# Altium footprint library Connectors THD.PcbLib: 631 footprints (part 3 of 46)
Each footprint in its own frame and in the unit in brackets; x right, y up, seen from the top. Pads: shape width x height; smd on the part's side, far side on the other; paste and mask are expansions set on the pad; w line width, h text height; cw(c..) or ccw(c..) is an arc to the next point about the centre after c.
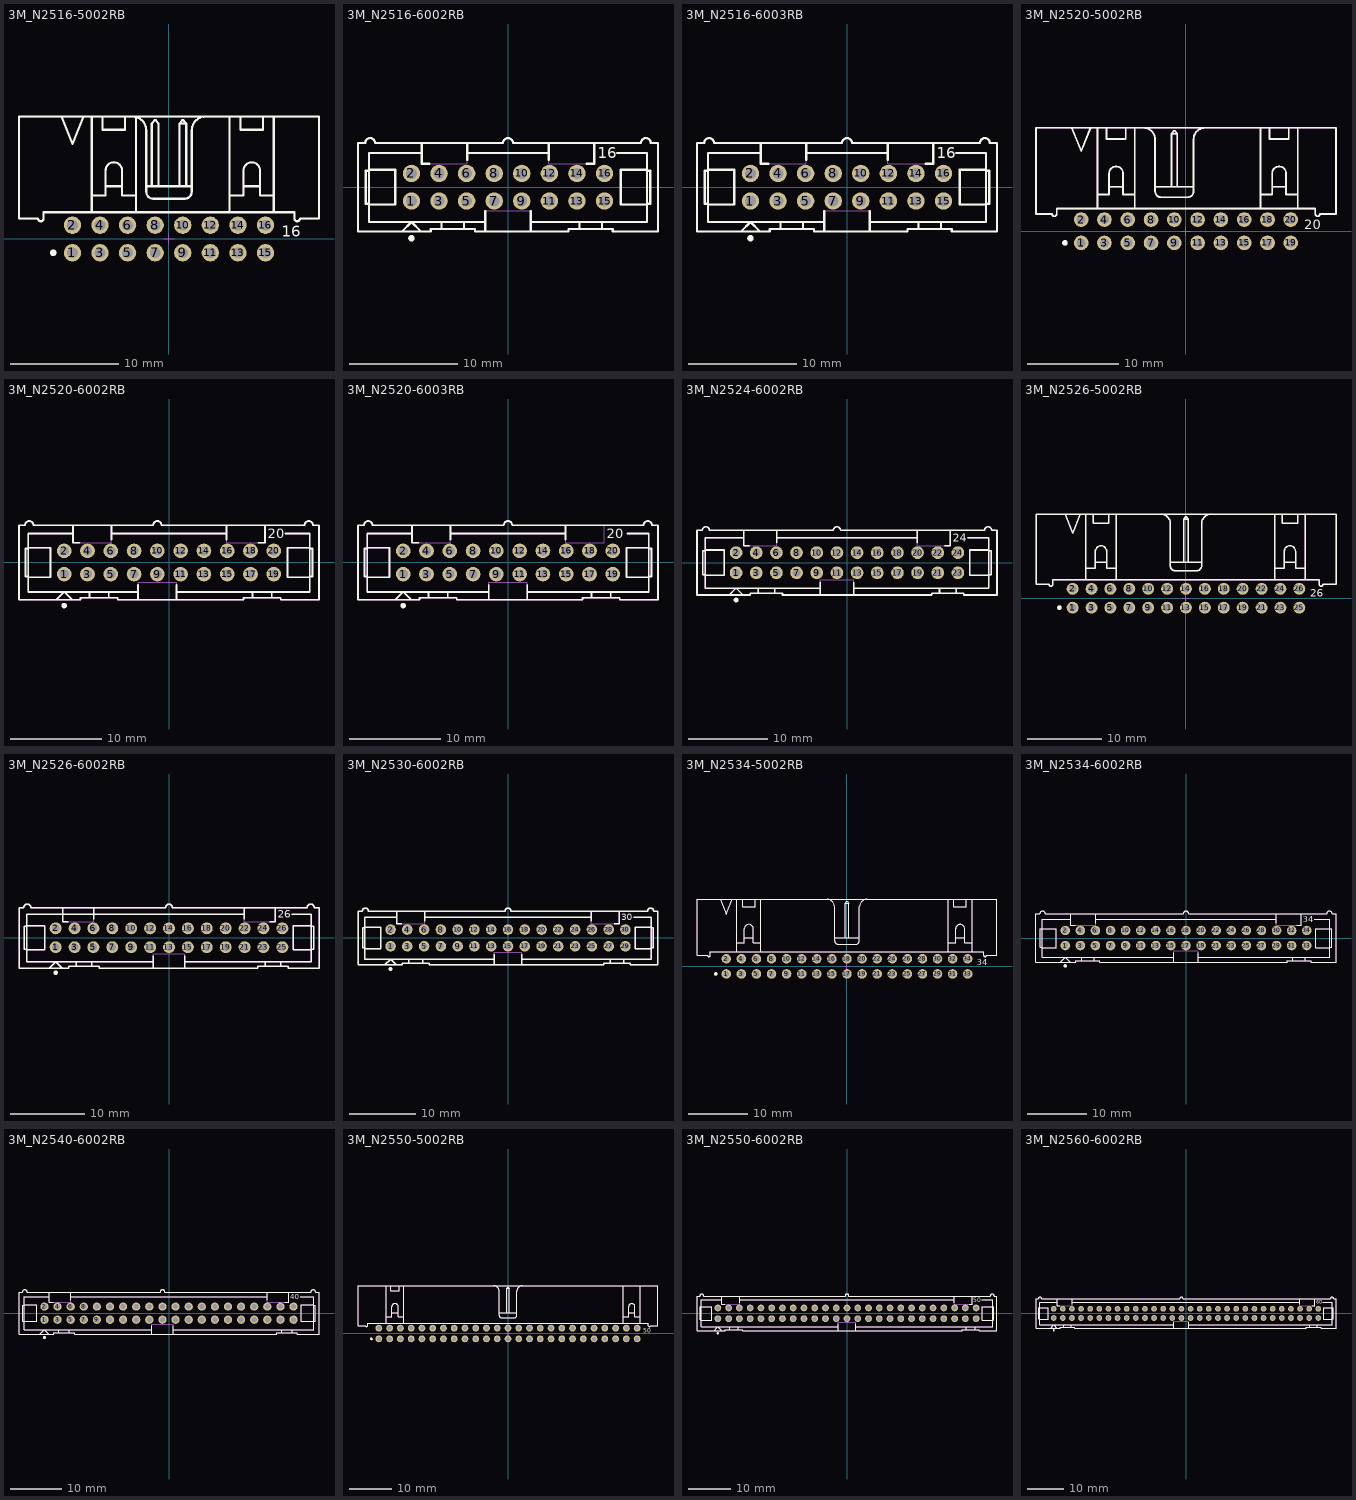
[diagram p2: the footprints below, top view; thin cyan lines are the x and y axes]

## 3M_N2516-5002RB [mm] "16 Contacts - Right Angle .100\" x .100\" Low Profile Four-Wall Header"
height 8.59
pads (16):
  round 1.6 hole 1: 1(-8.89,-1.27) 2(-8.89,1.27) 3(-6.35,-1.27) 4(-6.35,1.27) 5(-3.81,-1.27) 6(-3.81,1.27) 7(-1.27,-1.27) 8(-1.27,1.27) 9(1.27,-1.27) 10(1.27,1.27) 11(3.81,-1.27) 12(3.81,1.27) 13(6.35,-1.27) 14(6.35,1.27) 15(8.89,-1.27) 16(8.89,1.27)
Top Overlay:
  circle w0.3: c-10.66,-1.27 r0.15
  lines w0.2: -9.903,11.28 -8.887,8.74 -7.871,11.28 ; -7.109,2.466 -7.109,11.28 ; -7.109,4.015 -5.839,4.015 -5.839,6.301 cw(c-5.077,6.301) -4.315,6.301 -4.315,4.015 -3.045,4.015 ; -6.118,11.28 -6.118,10.06 -4.035,10.06 -4.035,11.28 ; -5.839,4.854 -4.315,4.853 ; -3.362,11.28 cw(c-3.362,10.01) -2.092,10.01 -2.092,4.345 ccw(c-1.457,4.345) -1.457,3.71 ; -3.045,2.466 -3.045,11.239 ; -2.092,4.853 2.099,4.853 ; -1.584,4.853 -1.584,10.619 -1.323,10.954 -1.21,10.954 -0.956,10.628 -0.956,4.853 ; -1.457,3.71 1.464,3.71 ; 0.956,4.853 0.962,10.628 ; 1.464,3.71 ccw(c1.464,4.345) 2.099,4.345 2.099,10.01 ; 1.584,4.853 1.584,10.619 ; 2.099,10.01 cw(c3.369,10.01) 3.369,11.28 ; 5.591,2.466 5.591,11.28 ; 5.591,4.015 6.861,4.015 6.861,6.301 cw(c7.623,6.301) 8.385,6.301 8.385,4.015 9.655,4.015 ; 6.582,11.28 6.582,10.06 8.665,10.06 8.665,11.28 ; 6.861,4.853 8.385,4.853 ; 9.655,2.466 9.655,11.28 ; 0.962,10.628 1.584,10.619 ; 0.962,10.628 1.217,10.954 1.33,10.954 1.584,10.619 ; -13.814,1.882 -12.062,1.882 ccw(c-11.808,1.882) -11.554,1.882 -11.554,2.466 11.56,2.466 11.56,1.882 ccw(c11.814,1.882) 12.068,1.882 13.821,1.882 13.821,11.28 -13.814,11.28 -13.814,1.882
  text "16" at 10.375,0.207 h1.02
Mechanical 14:
  circle w0.3: c-10.66,-1.27 r0.15
  lines w0.1: -9.903,11.28 -8.887,8.74 -7.871,11.28 ; -7.109,2.466 -7.109,11.28 ; -7.109,4.015 -5.839,4.015 -5.839,6.301 cw(c-5.077,6.301) -4.315,6.301 -4.315,4.015 -3.045,4.015 ; -6.118,11.28 -6.118,10.06 -4.035,10.06 -4.035,11.28 ; -5.839,4.854 -4.315,4.853 ; -3.362,11.28 cw(c-3.362,10.01) -2.092,10.01 -2.092,4.345 ccw(c-1.457,4.345) -1.457,3.71 ; -3.045,2.466 -3.045,11.239 ; -2.092,4.853 2.099,4.853 ; -1.584,4.853 -1.584,10.619 -1.323,10.954 -1.21,10.954 -0.956,10.628 -0.956,4.853 ; -1.457,3.71 1.464,3.71 ; 0.956,4.853 0.962,10.628 ; 1.464,3.71 ccw(c1.464,4.345) 2.099,4.345 2.099,10.01 ; 1.584,4.853 1.584,10.619 ; 2.099,10.01 cw(c3.369,10.01) 3.369,11.28 ; 5.591,2.466 5.591,11.28 ; 5.591,4.015 6.861,4.015 6.861,6.301 cw(c7.623,6.301) 8.385,6.301 8.385,4.015 9.655,4.015 ; 6.582,11.28 6.582,10.06 8.665,10.06 8.665,11.28 ; 6.861,4.853 8.385,4.853 ; 9.655,2.466 9.655,11.28 ; 0.962,10.628 1.584,10.619 ; 0.962,10.628 1.217,10.954 1.33,10.954 1.584,10.619 ; -13.814,1.882 -12.062,1.882 ccw(c-11.808,1.882) -11.554,1.882 -11.554,2.466 11.56,2.466 11.56,1.882 ccw(c11.814,1.882) 12.068,1.882 13.821,1.882 13.821,11.28 -13.814,11.28 -13.814,1.882
  text "16" at 10.375,0.207 h1.02
Mechanical 15:
  lines w0.05: -0.5,0 0.5,0 ; 0,-0.5 0,0.5
3D body: height 8.64, standoff -3.98, extent -13.814,-1.587 13.821,11.267

## 3M_N2516-6002RB [mm] "16 Contacts - Straight .100\" x .100\" Low Profile Four-Wall Header"
height 10.03
pads (16):
  round 1.6 hole 1: 1(-8.89,-1.27) 2(-8.89,1.27) 3(-6.35,-1.27) 4(-6.35,1.27) 5(-3.81,-1.27) 6(-3.81,1.27) 7(-1.27,-1.27) 8(-1.27,1.27) 9(1.27,-1.27) 10(1.27,1.27) 11(3.81,-1.27) 12(3.81,1.27) 13(6.35,-1.27) 14(6.35,1.27) 15(8.89,-1.27) 16(8.89,1.27)
Top Overlay:
  circle w0.3: c-8.89,-4.699 r0.15
  lines w0.2: -12.802,-1.603 -10.389,-1.603 -10.389,1.603 -12.802,1.603 ; -12.802,-1.524 -13.106,-1.524 -13.106,1.524 -12.802,1.524 ; -9.754,-4.064 -8.89,-3.2 -8.026,-4.064 ; -7.938,3.15 -12.802,3.15 -12.802,-3.2 -2.096,-3.2 ; -7.938,4.064 -7.938,2.159 -7.229,2.159 ; -6.121,-3.835 -6.121,-3.2 ; -4.039,-3.835 -4.039,-3.2 ; -3.747,2.518 -3.747,4.064 ; -3.747,3.15 3.747,3.15 ; -2.096,-4.064 -2.096,-2.209 ; 2.095,-4.064 2.095,-2.209 ; 2.095,-3.2 12.802,-3.2 12.802,3.15 10.033,3.15 ; 3.747,2.518 3.747,4.064 ; 6.579,-3.835 6.579,-3.2 ; 7.229,2.159 7.938,2.159 7.938,4.064 ; 8.661,-3.835 8.661,-3.2 ; 12.802,-1.603 10.389,-1.603 10.389,1.603 12.802,1.603 ; 12.802,-1.524 13.106,-1.524 13.106,1.524 12.802,1.524 ; -13.818,-4.064 -7.112,-4.064 -7.112,-3.835 -3.048,-3.835 -3.048,-4.064 5.588,-4.064 5.588,-3.835 9.652,-3.835 9.652,-4.064 13.818,-4.064 13.818,4.064 13.157,4.064 ccw(c12.7,4.064) 12.243,4.064 0.457,4.064 ccw(c0,4.064) -0.457,4.064 -12.243,4.064 ccw(c-12.7,4.064) -13.157,4.064 -13.818,4.064 -13.818,-4.064
  text "16" at 8.255,2.667 h1.02
Mechanical 14:
  lines w0.1: -12.802,-1.603 -10.389,-1.603 -10.389,1.603 -12.802,1.603 ; -12.802,-1.524 -13.106,-1.524 -13.106,1.524 -12.802,1.524 ; -9.754,-4.064 -8.89,-3.2 -8.026,-4.064 ; -7.938,3.15 -12.802,3.15 -12.802,-3.2 -2.096,-3.2 ; -7.938,4.064 -7.938,2.159 -3.747,2.159 -3.747,4.064 ; -6.121,-3.835 -6.121,-3.2 ; -4.039,-3.835 -4.039,-3.2 ; -3.747,3.15 3.747,3.15 ; -2.096,-4.064 -2.096,-2.159 2.095,-2.159 2.095,-4.064 ; 2.095,-3.2 12.802,-3.2 12.802,3.15 10.033,3.15 ; 3.747,4.064 3.747,2.159 7.938,2.159 7.938,4.064 ; 6.579,-3.835 6.579,-3.2 ; 8.661,-3.835 8.661,-3.2 ; 12.802,-1.603 10.389,-1.603 10.389,1.603 12.802,1.603 ; 12.802,-1.524 13.106,-1.524 13.106,1.524 12.802,1.524 ; -13.818,-4.064 -7.112,-4.064 -7.112,-3.835 -3.048,-3.835 -3.048,-4.064 5.588,-4.064 5.588,-3.835 9.652,-3.835 9.652,-4.064 13.818,-4.064 13.818,4.064 13.157,4.064 ccw(c12.7,4.064) 12.243,4.064 0.457,4.064 ccw(c0,4.064) -0.457,4.064 -12.243,4.064 ccw(c-12.7,4.064) -13.157,4.064 -13.818,4.064 -13.818,-4.064
  text "16" at 8.255,2.667 h1.02
3D body: height 9.65, standoff -2.59, extent -13.818,-4.064 13.818,4.572

## 3M_N2516-6003RB [mm] "16 Contacts - Straight .100\" x .100\" Low Profile Four-Wall Header (Solder Tail 3.94mm)"
height 10.03
pads (16):
  round 1.6 hole 1: 1(-8.89,-1.27) 2(-8.89,1.27) 3(-6.35,-1.27) 4(-6.35,1.27) 5(-3.81,-1.27) 6(-3.81,1.27) 7(-1.27,-1.27) 8(-1.27,1.27) 9(1.27,-1.27) 10(1.27,1.27) 11(3.81,-1.27) 12(3.81,1.27) 13(6.35,-1.27) 14(6.35,1.27) 15(8.89,-1.27) 16(8.89,1.27)
Top Overlay:
  circle w0.3: c-8.89,-4.699 r0.15
  lines w0.2: -12.802,-1.603 -10.389,-1.603 -10.389,1.603 -12.802,1.603 ; -12.802,-1.524 -13.106,-1.524 -13.106,1.524 -12.802,1.524 ; -9.754,-4.064 -8.89,-3.2 -8.026,-4.064 ; -7.938,3.15 -12.802,3.15 -12.802,-3.2 -2.096,-3.2 ; -7.938,4.064 -7.938,2.159 -7.229,2.159 ; -6.121,-3.835 -6.121,-3.2 ; -4.039,-3.835 -4.039,-3.2 ; -3.747,2.518 -3.747,4.064 ; -3.747,3.15 3.747,3.15 ; -2.096,-4.064 -2.096,-2.209 ; 2.095,-4.064 2.095,-2.209 ; 2.095,-3.2 12.802,-3.2 12.802,3.15 10.033,3.15 ; 3.747,2.518 3.747,4.064 ; 6.579,-3.835 6.579,-3.2 ; 7.229,2.159 7.938,2.159 7.938,4.064 ; 8.661,-3.835 8.661,-3.2 ; 12.802,-1.603 10.389,-1.603 10.389,1.603 12.802,1.603 ; 12.802,-1.524 13.106,-1.524 13.106,1.524 12.802,1.524 ; -13.818,-4.064 -7.112,-4.064 -7.112,-3.835 -3.048,-3.835 -3.048,-4.064 5.588,-4.064 5.588,-3.835 9.652,-3.835 9.652,-4.064 13.818,-4.064 13.818,4.064 13.157,4.064 ccw(c12.7,4.064) 12.243,4.064 0.457,4.064 ccw(c0,4.064) -0.457,4.064 -12.243,4.064 ccw(c-12.7,4.064) -13.157,4.064 -13.818,4.064 -13.818,-4.064
  text "16" at 8.255,2.667 h1.02
Mechanical 14:
  lines w0.1: -12.802,-1.603 -10.389,-1.603 -10.389,1.603 -12.802,1.603 ; -12.802,-1.524 -13.106,-1.524 -13.106,1.524 -12.802,1.524 ; -9.754,-4.064 -8.89,-3.2 -8.026,-4.064 ; -7.938,3.15 -12.802,3.15 -12.802,-3.2 -2.096,-3.2 ; -7.938,4.064 -7.938,2.159 -3.747,2.159 -3.747,4.064 ; -6.121,-3.835 -6.121,-3.2 ; -4.039,-3.835 -4.039,-3.2 ; -3.747,3.15 3.747,3.15 ; -2.096,-4.064 -2.096,-2.159 2.095,-2.159 2.095,-4.064 ; 2.095,-3.2 12.802,-3.2 12.802,3.15 10.033,3.15 ; 3.747,4.064 3.747,2.159 7.938,2.159 7.938,4.064 ; 6.579,-3.835 6.579,-3.2 ; 8.661,-3.835 8.661,-3.2 ; 12.802,-1.603 10.389,-1.603 10.389,1.603 12.802,1.603 ; 12.802,-1.524 13.106,-1.524 13.106,1.524 12.802,1.524 ; -13.818,-4.064 -7.112,-4.064 -7.112,-3.835 -3.048,-3.835 -3.048,-4.064 5.588,-4.064 5.588,-3.835 9.652,-3.835 9.652,-4.064 13.818,-4.064 13.818,4.064 13.157,4.064 ccw(c12.7,4.064) 12.243,4.064 0.457,4.064 ccw(c0,4.064) -0.457,4.064 -12.243,4.064 ccw(c-12.7,4.064) -13.157,4.064 -13.818,4.064 -13.818,-4.064
  text "16" at 8.255,2.667 h1.02
3D body: height 9.65, standoff -3.1, extent -13.818,-4.064 13.818,4.572

## 3M_N2520-5002RB [mm] "20 Contacts - Right Angle .100\" x .100\" Low Profile Four-Wall Header"
height 8.59
pads (20):
  round 1.6 hole 1: 1(-11.43,-1.27) 2(-11.43,1.27) 3(-8.89,-1.27) 4(-8.89,1.27) 5(-6.35,-1.27) 6(-6.35,1.27) 7(-3.81,-1.27) 8(-3.81,1.27) 9(-1.27,-1.27) 10(-1.27,1.27) 11(1.27,-1.27) 12(1.27,1.27) 13(3.81,-1.27) 14(3.81,1.27) 15(6.35,-1.27) 16(6.35,1.27) 17(8.89,-1.27) 18(8.89,1.27) 19(11.43,-1.27) 20(11.43,1.27)
Top Overlay:
  circle w0.3: c-13.2,-1.27 r0.15
  lines w0.2: -12.443,11.28 -11.427,8.74 -10.411,11.28 ; -9.649,2.466 -9.649,11.28 ; -9.649,4.015 -8.379,4.015 -8.379,6.301 cw(c-7.617,6.301) -6.855,6.301 -6.855,4.015 -5.585,4.015 ; -8.658,11.28 -8.658,10.06 -6.575,10.06 -6.575,11.28 ; -8.379,4.854 -6.855,4.853 ; -5.585,2.466 -5.585,11.239 ; -4.632,11.28 cw(c-4.632,10.01) -3.362,10.01 -3.362,4.345 ccw(c-2.727,4.345) -2.727,3.71 0.194,3.71 ; -3.362,4.853 0.829,4.853 ; -1.581,4.853 -0.953,4.853 -0.953,10.619 ; -1.575,4.853 -1.575,10.628 ; 0.194,3.71 ccw(c0.194,4.345) 0.829,4.345 0.829,10.01 cw(c2.099,10.01) 2.099,11.28 ; 8.131,2.466 8.131,11.28 ; 8.131,4.015 9.401,4.015 9.401,6.301 cw(c10.163,6.301) 10.925,6.301 10.925,4.015 12.195,4.015 ; 9.122,11.28 9.122,10.06 11.205,10.06 11.205,11.28 ; 9.401,4.853 10.925,4.853 ; 12.195,2.466 12.195,11.28 ; -1.575,10.628 -1.32,10.954 -1.207,10.954 -0.953,10.619 ; -1.575,10.628 -0.953,10.619 ; -16.354,1.882 -16.354,11.28 16.361,11.28 16.361,1.882 14.608,1.882 cw(c14.354,1.882) 14.1,1.882 14.1,2.466 -14.094,2.466 -14.094,1.882 cw(c-14.348,1.882) -14.602,1.882 -16.354,1.882
  text "20" at 12.915,0.207 h1.02
Mechanical 14:
  circle w0.3: c-13.2,-1.27 r0.15
  lines w0.1: -12.443,11.28 -11.427,8.74 -10.411,11.28 ; -9.649,2.466 -9.649,11.28 ; -9.649,4.015 -8.379,4.015 -8.379,6.301 cw(c-7.617,6.301) -6.855,6.301 -6.855,4.015 -5.585,4.015 ; -8.658,11.28 -8.658,10.06 -6.575,10.06 -6.575,11.28 ; -8.379,4.854 -6.855,4.853 ; -5.585,2.466 -5.585,11.239 ; -4.632,11.28 cw(c-4.632,10.01) -3.362,10.01 -3.362,4.345 ccw(c-2.727,4.345) -2.727,3.71 0.194,3.71 ; -3.362,4.853 0.829,4.853 ; -1.581,4.853 -0.953,4.853 -0.953,10.619 ; -1.575,4.853 -1.575,10.628 ; 0.194,3.71 ccw(c0.194,4.345) 0.829,4.345 0.829,10.01 cw(c2.099,10.01) 2.099,11.28 ; 8.131,2.466 8.131,11.28 ; 8.131,4.015 9.401,4.015 9.401,6.301 cw(c10.163,6.301) 10.925,6.301 10.925,4.015 12.195,4.015 ; 9.122,11.28 9.122,10.06 11.205,10.06 11.205,11.28 ; 9.401,4.853 10.925,4.853 ; 12.195,2.466 12.195,11.28 ; -1.575,10.628 -1.32,10.954 -1.207,10.954 -0.953,10.619 ; -1.575,10.628 -0.953,10.619 ; -16.354,1.882 -16.354,11.28 16.361,11.28 16.361,1.882 14.608,1.882 cw(c14.354,1.882) 14.1,1.882 14.1,2.466 -14.094,2.466 -14.094,1.882 cw(c-14.348,1.882) -14.602,1.882 -16.354,1.882
  text "20" at 12.915,0.207 h1.02
Mechanical 15:
  lines w0.05: -0.5,0 0.5,0 ; 0,-0.5 0,0.5
3D body: height 8.64, standoff -3.98, extent -16.354,-1.587 16.361,11.267

## 3M_N2520-6002RB [mm] "20 Contacts - Straight .100\" x .100\" Low Profile Four-Wall Header"
height 10.03
pads (20):
  round 1.6 hole 1: 1(-11.43,-1.27) 2(-11.43,1.27) 3(-8.89,-1.27) 4(-8.89,1.27) 5(-6.35,-1.27) 6(-6.35,1.27) 7(-3.81,-1.27) 8(-3.81,1.27) 9(-1.27,-1.27) 10(-1.27,1.27) 11(1.27,-1.27) 12(1.27,1.27) 13(3.81,-1.27) 14(3.81,1.27) 15(6.35,-1.27) 16(6.35,1.27) 17(8.89,-1.27) 18(8.89,1.27) 19(11.43,-1.27) 20(11.43,1.27)
Top Overlay:
  circle w0.3: c-11.43,-4.699 r0.15
  lines w0.2: -15.342,-1.603 -12.929,-1.603 -12.929,1.603 -15.342,1.603 ; -15.342,-1.524 -15.646,-1.524 -15.646,1.524 -15.342,1.524 ; -12.294,-4.064 -11.43,-3.2 -10.566,-4.064 ; -10.478,3.15 -15.342,3.15 -15.342,-3.2 -3.366,-3.2 ; -10.478,4.064 -10.478,2.159 -9.769,2.159 ; -8.661,-3.835 -8.661,-3.2 ; -6.579,-3.835 -6.579,-3.2 ; -6.287,2.518 -6.287,4.064 ; -6.287,3.15 6.287,3.15 ; -3.366,-4.064 -3.366,-2.438 ; 0.826,-4.064 0.826,-2.438 ; 0.826,-3.2 15.342,-3.2 15.342,3.15 12.7,3.15 ; 6.287,2.518 6.287,4.064 ; 9.119,-3.835 9.119,-3.2 ; 9.769,2.159 10.478,2.159 10.478,4.064 ; 11.201,-3.835 11.201,-3.2 ; 15.342,-1.603 12.929,-1.603 12.929,1.603 15.342,1.603 ; 15.342,-1.524 15.646,-1.524 15.646,1.524 15.342,1.524 ; -16.358,-4.064 -16.358,4.064 -15.697,4.064 cw(c-15.24,4.064) -14.783,4.064 -1.727,4.064 cw(c-1.27,4.064) -0.813,4.064 14.783,4.064 cw(c15.24,4.064) 15.697,4.064 16.358,4.064 16.358,-4.064 12.192,-4.064 12.192,-3.835 8.128,-3.835 8.128,-4.064 -5.588,-4.064 -5.588,-3.835 -9.652,-3.835 -9.652,-4.064 -16.358,-4.064
  text "20" at 10.795,2.667 h1.02
Mechanical 14:
  lines w0.1: -15.342,-1.603 -12.929,-1.603 -12.929,1.603 -15.342,1.603 ; -15.342,-1.524 -15.646,-1.524 -15.646,1.524 -15.342,1.524 ; -12.294,-4.064 -11.43,-3.2 -10.566,-4.064 ; -10.478,3.15 -15.342,3.15 -15.342,-3.2 -3.366,-3.2 ; -10.478,4.064 -10.478,2.159 -6.287,2.159 -6.287,4.064 ; -8.661,-3.835 -8.661,-3.2 ; -6.579,-3.835 -6.579,-3.2 ; -6.287,3.15 6.287,3.15 ; -3.366,-4.064 -3.366,-2.159 0.826,-2.159 0.826,-4.064 ; 0.826,-3.2 15.342,-3.2 15.342,3.15 12.7,3.15 ; 6.287,4.064 6.287,2.159 10.478,2.159 10.478,4.064 ; 9.119,-3.835 9.119,-3.2 ; 11.201,-3.835 11.201,-3.2 ; 15.342,-1.603 12.929,-1.603 12.929,1.603 15.342,1.603 ; 15.342,-1.524 15.646,-1.524 15.646,1.524 15.342,1.524 ; -16.358,-4.064 -16.358,4.064 -15.697,4.064 cw(c-15.24,4.064) -14.783,4.064 -1.727,4.064 cw(c-1.27,4.064) -0.813,4.064 14.783,4.064 cw(c15.24,4.064) 15.697,4.064 16.358,4.064 16.358,-4.064 12.192,-4.064 12.192,-3.835 8.128,-3.835 8.128,-4.064 -5.588,-4.064 -5.588,-3.835 -9.652,-3.835 -9.652,-4.064 -16.358,-4.064
  text "20" at 10.795,2.667 h1.02
3D body: height 9.65, standoff -2.59, extent -16.358,-4.064 16.358,4.572

## 3M_N2520-6003RB [mm] "20 Contacts - Straight .100\" x .100\" Low Profile Four-Wall Header (Solder Tail 3.94mm)"
height 10.03
pads (20):
  round 1.6 hole 1: 1(-11.43,-1.27) 2(-11.43,1.27) 3(-8.89,-1.27) 4(-8.89,1.27) 5(-6.35,-1.27) 6(-6.35,1.27) 7(-3.81,-1.27) 8(-3.81,1.27) 9(-1.27,-1.27) 10(-1.27,1.27) 11(1.27,-1.27) 12(1.27,1.27) 13(3.81,-1.27) 14(3.81,1.27) 15(6.35,-1.27) 16(6.35,1.27) 17(8.89,-1.27) 18(8.89,1.27) 19(11.43,-1.27) 20(11.43,1.27)
Top Overlay:
  circle w0.3: c-11.43,-4.699 r0.15
  lines w0.2: -15.342,-1.603 -12.929,-1.603 -12.929,1.603 -15.342,1.603 ; -15.342,-1.524 -15.646,-1.524 -15.646,1.524 -15.342,1.524 ; -12.294,-4.064 -11.43,-3.2 -10.566,-4.064 ; -10.478,3.15 -15.342,3.15 -15.342,-3.2 -2.096,-3.2 ; -10.478,4.064 -10.478,2.159 -9.769,2.159 ; -8.661,-3.835 -8.661,-3.2 ; -6.579,-3.835 -6.579,-3.2 ; -6.287,2.518 -6.287,4.064 ; -6.287,3.15 6.287,3.15 ; -2.096,-4.064 -2.096,-2.438 ; 2.095,-4.064 2.095,-2.438 ; 2.095,-3.2 15.342,-3.2 15.342,3.15 13.018,3.15 ; 6.287,2.518 6.287,4.064 ; 9.119,-3.835 9.119,-3.2 ; 11.201,-3.835 11.201,-3.2 ; 15.342,-1.603 12.929,-1.603 12.929,1.603 15.342,1.603 ; 15.342,-1.524 15.646,-1.524 15.646,1.524 15.342,1.524 ; -16.358,-4.064 -16.358,4.064 -15.697,4.064 cw(c-15.24,4.064) -14.783,4.064 -0.457,4.064 cw(c0,4.064) 0.457,4.064 14.783,4.064 cw(c15.24,4.064) 15.697,4.064 16.358,4.064 16.358,-4.064 12.192,-4.064 12.192,-3.835 8.128,-3.835 8.128,-4.064 -5.588,-4.064 -5.588,-3.835 -9.652,-3.835 -9.652,-4.064 -16.358,-4.064
  text "20" at 10.795,2.667 h1.02
Mechanical 14:
  lines w0.1: -15.342,-1.603 -12.929,-1.603 -12.929,1.603 -15.342,1.603 ; -15.342,-1.524 -15.646,-1.524 -15.646,1.524 -15.342,1.524 ; -12.294,-4.064 -11.43,-3.2 -10.566,-4.064 ; -10.478,3.15 -15.342,3.15 -15.342,-3.2 -2.096,-3.2 ; -10.478,4.064 -10.478,2.159 -6.287,2.159 -6.287,4.064 ; -8.661,-3.835 -8.661,-3.2 ; -6.579,-3.835 -6.579,-3.2 ; -6.287,3.15 6.287,3.15 ; -2.096,-4.064 -2.096,-2.159 2.095,-2.159 2.095,-4.064 ; 2.095,-3.2 15.342,-3.2 15.342,3.15 13.018,3.15 ; 6.287,4.064 6.287,2.159 10.478,2.159 10.478,4.064 ; 9.119,-3.835 9.119,-3.2 ; 11.201,-3.835 11.201,-3.2 ; 15.342,-1.603 12.929,-1.603 12.929,1.603 15.342,1.603 ; 15.342,-1.524 15.646,-1.524 15.646,1.524 15.342,1.524 ; -16.358,-4.064 -16.358,4.064 -15.697,4.064 cw(c-15.24,4.064) -14.783,4.064 -0.457,4.064 cw(c0,4.064) 0.457,4.064 14.783,4.064 cw(c15.24,4.064) 15.697,4.064 16.358,4.064 16.358,-4.064 12.192,-4.064 12.192,-3.835 8.128,-3.835 8.128,-4.064 -5.588,-4.064 -5.588,-3.835 -9.652,-3.835 -9.652,-4.064 -16.358,-4.064
  text "20" at 10.795,2.667 h1.02
3D body: height 9.65, standoff -3.94, extent -16.358,-4.064 16.358,4.572

## 3M_N2524-6002RB [mm] "24 Contacts - Straight .100\" x .100\" Low Profile Four-Wall Header"
height 10.03
pads (24):
  round 1.6 hole 1: 1(-13.97,-1.27) 2(-13.97,1.27) 3(-11.43,-1.27) 4(-11.43,1.27) 5(-8.89,-1.27) 6(-8.89,1.27) 7(-6.35,-1.27) 8(-6.35,1.27) 9(-3.81,-1.27) 10(-3.81,1.27) 11(-1.27,-1.27) 12(-1.27,1.27) 13(1.27,-1.27) 14(1.27,1.27) 15(3.81,-1.27) 16(3.81,1.27) 17(6.35,-1.27) 18(6.35,1.27) 19(8.89,-1.27) 20(8.89,1.27) 21(11.43,-1.27) 22(11.43,1.27) 23(13.97,-1.27) 24(13.97,1.27)
Top Overlay:
  circle w0.3: c-13.97,-4.699 r0.15
  lines w0.2: -17.882,-1.603 -15.469,-1.603 -15.469,1.603 -17.882,1.603 ; -17.882,-1.524 -18.186,-1.524 -18.186,1.524 -17.882,1.524 ; -14.834,-4.064 -13.97,-3.2 -13.106,-4.064 ; -13.018,3.15 -17.882,3.15 -17.882,-3.2 -3.366,-3.2 ; -13.018,4.064 -13.018,2.159 -12.309,2.159 ; -11.201,-3.835 -11.201,-3.2 ; -9.119,-3.835 -9.119,-3.2 ; -8.827,2.518 -8.827,4.064 ; -8.827,3.15 8.827,3.15 ; -3.366,-4.064 -3.366,-2.438 ; 0.826,-4.064 0.826,-2.438 ; 0.826,-3.2 17.882,-3.2 17.882,3.15 15.24,3.15 ; 8.827,2.518 8.827,4.064 ; 11.659,-3.835 11.659,-3.2 ; 12.309,2.159 13.018,2.159 13.018,4.064 ; 13.741,-3.835 13.741,-3.2 ; 17.882,-1.603 15.469,-1.603 15.469,1.603 17.882,1.603 ; 17.882,-1.524 18.186,-1.524 18.186,1.524 17.882,1.524 ; -18.898,-4.064 -12.192,-4.064 -12.192,-3.835 -8.128,-3.835 -8.128,-4.064 10.668,-4.064 10.668,-3.835 14.732,-3.835 14.732,-4.064 18.898,-4.064 18.898,4.064 18.237,4.064 ccw(c17.78,4.064) 17.323,4.064 -0.813,4.064 ccw(c-1.27,4.064) -1.727,4.064 -17.323,4.064 ccw(c-17.78,4.064) -18.237,4.064 -18.898,4.064 -18.898,-4.064
  text "24" at 13.335,2.667 h1.02
Mechanical 14:
  lines w0.1: -17.882,-1.603 -15.469,-1.603 -15.469,1.603 -17.882,1.603 ; -17.882,-1.524 -18.186,-1.524 -18.186,1.524 -17.882,1.524 ; -14.834,-4.064 -13.97,-3.2 -13.106,-4.064 ; -13.018,3.15 -17.882,3.15 -17.882,-3.2 -3.366,-3.2 ; -13.018,4.064 -13.018,2.159 -8.827,2.159 -8.827,4.064 ; -11.201,-3.835 -11.201,-3.2 ; -9.119,-3.835 -9.119,-3.2 ; -8.827,3.15 8.827,3.15 ; -3.366,-4.064 -3.366,-2.159 0.826,-2.159 0.826,-4.064 ; 0.826,-3.2 17.882,-3.2 17.882,3.15 15.24,3.15 ; 8.827,4.064 8.827,2.159 13.018,2.159 13.018,4.064 ; 11.659,-3.835 11.659,-3.2 ; 13.741,-3.835 13.741,-3.2 ; 17.882,-1.603 15.469,-1.603 15.469,1.603 17.882,1.603 ; 17.882,-1.524 18.186,-1.524 18.186,1.524 17.882,1.524 ; -18.898,-4.064 -12.192,-4.064 -12.192,-3.835 -8.128,-3.835 -8.128,-4.064 10.668,-4.064 10.668,-3.835 14.732,-3.835 14.732,-4.064 18.898,-4.064 18.898,4.064 18.237,4.064 ccw(c17.78,4.064) 17.323,4.064 -0.813,4.064 ccw(c-1.27,4.064) -1.727,4.064 -17.323,4.064 ccw(c-17.78,4.064) -18.237,4.064 -18.898,4.064 -18.898,-4.064
  text "24" at 13.335,2.667 h1.02
3D body: height 9.65, standoff -2.59, extent -18.898,-4.064 18.898,4.572

## 3M_N2526-5002RB [mm] "26 Contacts - Right Angle .100\" x .100\" Low Profile Four-Wall Header"
height 8.59
pads (26):
  round 1.6 hole 1: 1(-15.24,-1.27) 2(-15.24,1.27) 3(-12.7,-1.27) 4(-12.7,1.27) 5(-10.16,-1.27) 6(-10.16,1.27) 7(-7.62,-1.27) 8(-7.62,1.27) 9(-5.08,-1.27) 10(-5.08,1.27) 11(-2.54,-1.27) 12(-2.54,1.27) 13(0,-1.27) 14(0,1.27) 15(2.54,-1.27) 16(2.54,1.27) 17(5.08,-1.27) 18(5.08,1.27) 19(7.62,-1.27) 20(7.62,1.27) 21(10.16,-1.27) 22(10.16,1.27) 23(12.7,-1.27) 24(12.7,1.27) 25(15.24,-1.27) 26(15.24,1.27)
Top Overlay:
  circle w0.3: c-17.01,-1.27 r0.15
  lines w0.2: -16.253,11.28 -15.237,8.74 -14.221,11.28 ; -13.459,2.466 -13.459,11.28 ; -13.459,4.015 -12.189,4.015 -12.189,6.301 cw(c-11.427,6.301) -10.665,6.301 -10.665,4.015 -9.395,4.015 ; -12.468,11.28 -12.468,10.06 -10.385,10.06 -10.385,11.28 ; -12.189,4.853 -10.665,4.853 ; -9.395,2.466 -9.395,11.28 ; -3.362,11.28 cw(c-3.362,10.01) -2.092,10.01 -2.092,4.345 ccw(c-1.457,4.345) -1.457,3.71 ; -2.092,4.853 2.099,4.853 ; -1.457,3.71 1.464,3.71 ; -0.311,4.853 0.318,4.853 0.318,10.619 ; -0.305,4.853 -0.305,10.628 ; 1.464,3.71 ccw(c1.464,4.345) 2.099,4.345 2.099,10.01 ; 2.099,10.01 cw(c3.369,10.01) 3.369,11.28 ; 11.941,2.466 11.941,11.28 ; 11.941,4.015 13.211,4.015 13.211,6.301 cw(c13.973,6.301) 14.735,6.301 14.735,4.015 16.005,4.015 ; 12.932,11.28 12.932,10.06 15.015,10.06 15.015,11.28 ; 13.211,4.853 14.735,4.853 ; 16.005,2.466 16.005,11.28 ; -0.305,10.628 -0.05,10.954 0.063,10.954 0.318,10.619 ; -0.305,10.628 0.318,10.619 ; -20.164,1.882 -20.164,11.28 20.171,11.28 20.171,1.882 18.418,1.882 cw(c18.164,1.882) 17.91,1.882 17.91,2.466 -17.904,2.466 -17.904,1.882 cw(c-18.158,1.882) -18.412,1.882 -20.164,1.882
  text "26" at 16.725,0.206 h1.02
Mechanical 14:
  circle w0.3: c-17.01,-1.27 r0.15
  lines w0.1: -16.253,11.28 -15.237,8.74 -14.221,11.28 ; -13.459,2.466 -13.459,11.28 ; -13.459,4.015 -12.189,4.015 -12.189,6.301 cw(c-11.427,6.301) -10.665,6.301 -10.665,4.015 -9.395,4.015 ; -12.468,11.28 -12.468,10.06 -10.385,10.06 -10.385,11.28 ; -12.189,4.853 -10.665,4.853 ; -9.395,2.466 -9.395,11.28 ; -3.362,11.28 cw(c-3.362,10.01) -2.092,10.01 -2.092,4.345 ccw(c-1.457,4.345) -1.457,3.71 ; -2.092,4.853 2.099,4.853 ; -1.457,3.71 1.464,3.71 ; -0.311,4.853 0.318,4.853 0.318,10.619 ; -0.305,4.853 -0.305,10.628 ; 1.464,3.71 ccw(c1.464,4.345) 2.099,4.345 2.099,10.01 ; 2.099,10.01 cw(c3.369,10.01) 3.369,11.28 ; 11.941,2.466 11.941,11.28 ; 11.941,4.015 13.211,4.015 13.211,6.301 cw(c13.973,6.301) 14.735,6.301 14.735,4.015 16.005,4.015 ; 12.932,11.28 12.932,10.06 15.015,10.06 15.015,11.28 ; 13.211,4.853 14.735,4.853 ; 16.005,2.466 16.005,11.28 ; -0.305,10.628 -0.05,10.954 0.063,10.954 0.318,10.619 ; -0.305,10.628 0.318,10.619 ; -20.164,1.882 -20.164,11.28 20.171,11.28 20.171,1.882 18.418,1.882 cw(c18.164,1.882) 17.91,1.882 17.91,2.466 -17.904,2.466 -17.904,1.882 cw(c-18.158,1.882) -18.412,1.882 -20.164,1.882